# Altium footprint library 我的器件.PCBLIB: 450 footprints (part 20 of 29)
Each footprint in its own frame and in the unit in brackets; x right, y up, seen from the top. Pads: shape width x height; smd on the part's side, far side on the other; paste and mask are expansions set on the pad; w line width, h text height; cw(c..) or ccw(c..) is an arc to the next point about the centre after c.
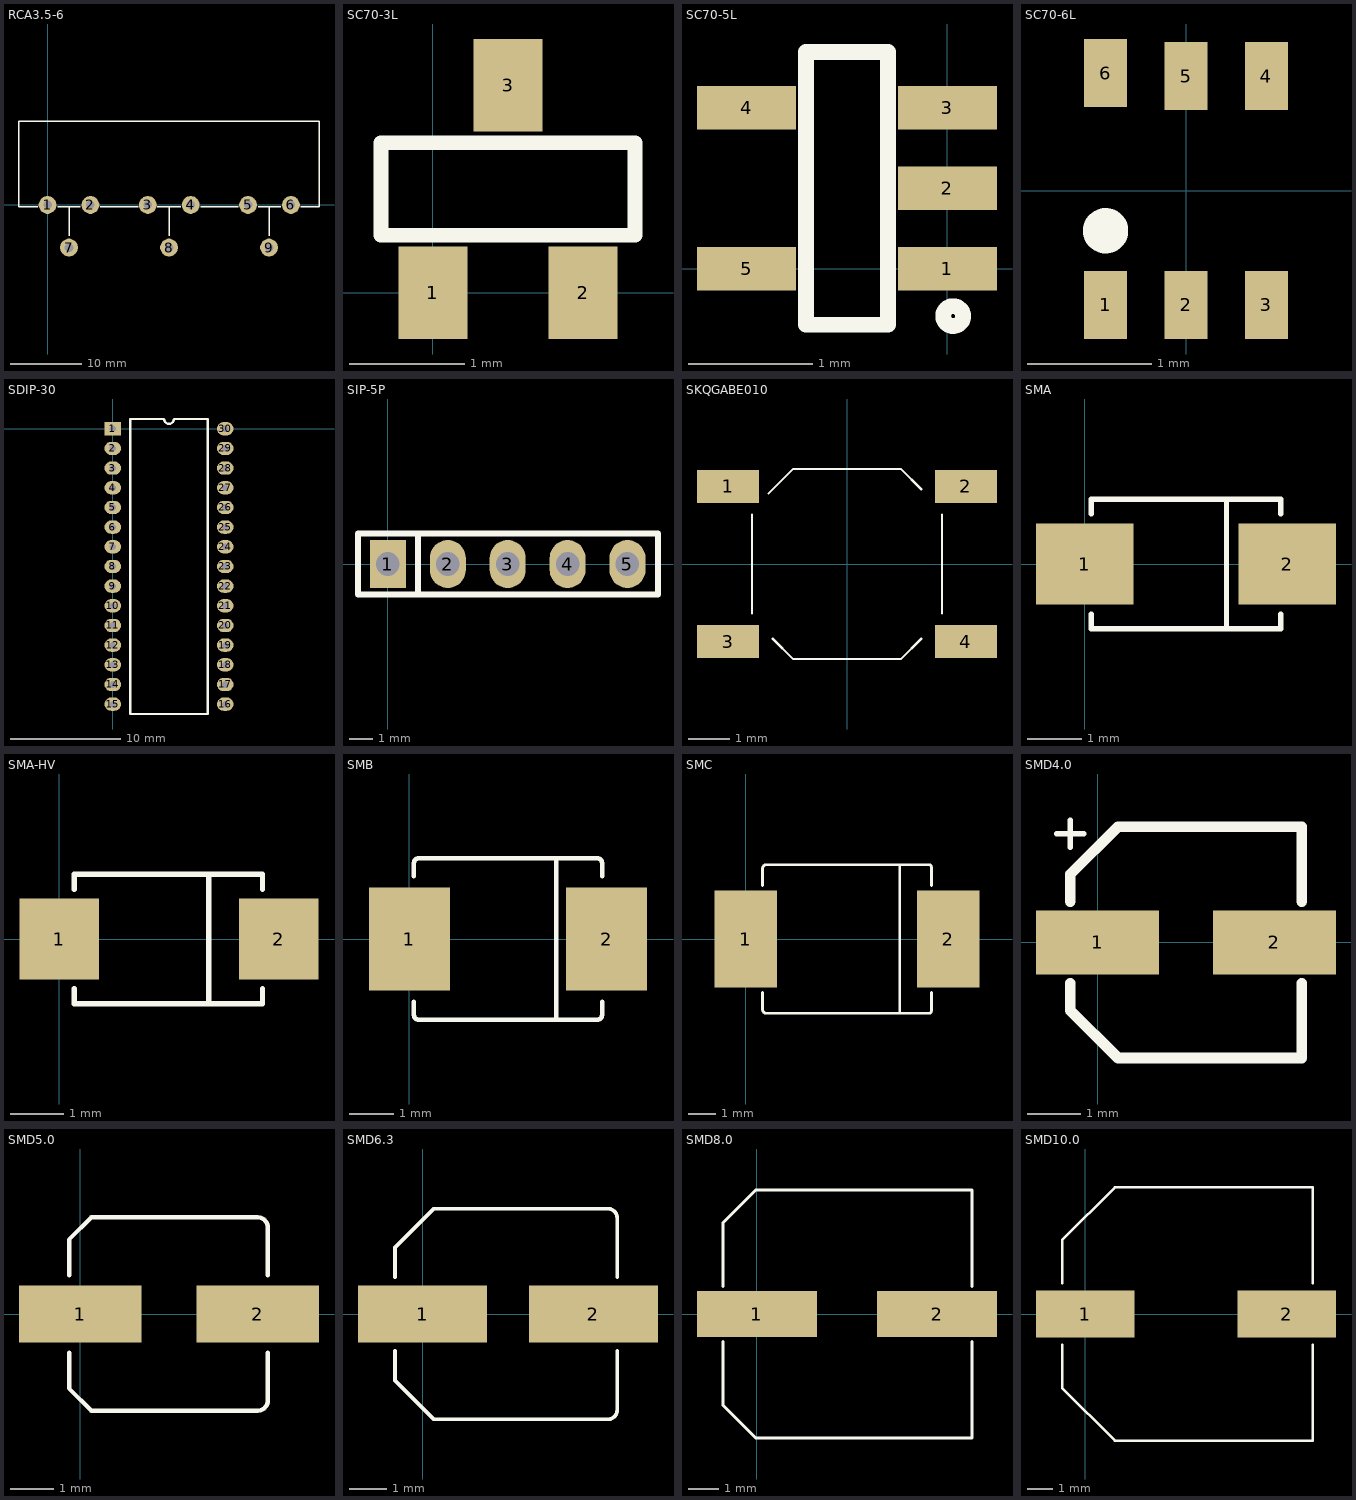
[diagram p19: the footprints below, top view; thin cyan lines are the x and y axes]

## RCA3.5-6 [mm]
pads (9):
  round 2.5 hole 1.2: 1(0,0) 2(6,0) 3(14.03,0) 4(20.03,0) 5(28.06,0) 6(34.06,0) 7(3,-5.969) 8(17,-5.969) 9(31,-5.969)
Top Overlay:
  lines w0.2: -1.397,-0.254 -4,-0.254 -4,11.684 37.985,11.684 37.985,-0.254 35.433,-0.254 ; 1.397,-0.254 4.572,-0.254 ; 3.048,-4.318 3.048,-0.254 ; 7.366,-0.254 12.7,-0.254 ; 15.367,-0.254 18.669,-0.254 ; 17.048,-4.318 17.048,-0.254 ; 21.463,-0.254 26.67,-0.254 ; 29.464,-0.254 32.639,-0.254 ; 31.048,-4.318 31.048,-0.254

## SC70-3L [mm]
height 4.45
pads (3):
  rect 0.6x0.8 smd: 1(0,0) 2(1.3,0) 3(0.65,1.8)
Top Overlay:
  lines w0.127: -0.45,0.5 -0.45,1.3 1.75,1.3 1.75,0.5 -0.45,0.5

## SC70-5L [mm]
height 1
pads (5):
  rect 0.8x0.35 smd: 1(0,0) 2(0,0.65) 3(0,1.3) 4(-1.62,1.3) 5(-1.62,0)
Top Overlay:
  circle w0.127: c0.047,-0.381 r0.08
  lines w0.127: -1.14,-0.45 -0.48,-0.45 -0.48,1.75 -1.14,1.75 -1.14,-0.45

## SC70-6L [mm]
height 1
pads (6):
  rect 0.35x0.55 smd: 1(-0.65,-0.925) 2(0,-0.925) 3(0.65,-0.925) 4(0.65,0.925) 5(0,0.925) 6(-0.65,0.95)
Top Overlay:
  circle w0.254: c-0.65,-0.325 r0.056
3D body: height 1.11, standoff 1.1, extent -0.799,-0.475 -0.5,-0.175
3D body: height 1.1, standoff 0.1, extent -1,-0.625 1,0.625
3D body: height 0.15, standoff 0, extent -0.15,0.8 0.15,1.2
3D body: height 0.7, standoff 0, extent -0.15,0.8 0.15,0.95
3D body: height 0.7, standoff 0.55, extent -0.15,0.625 0.15,0.8
3D body: height 0.7, standoff 0.55, extent 0.5,0.625 0.8,0.8
3D body: height 0.7, standoff 0, extent 0.5,0.8 0.8,0.95
3D body: height 0.15, standoff 0, extent 0.5,0.8 0.8,1.2
3D body: height 0.7, standoff 0.55, extent -0.8,0.625 -0.5,0.8
3D body: height 0.7, standoff 0, extent -0.8,0.8 -0.5,0.95
3D body: height 0.15, standoff 0, extent -0.8,0.8 -0.5,1.2
3D body: height 0.15, standoff 0, extent 0.5,-1.2 0.8,-0.8
3D body: height 0.7, standoff 0, extent 0.5,-0.95 0.8,-0.8
3D body: height 0.7, standoff 0.55, extent 0.5,-0.8 0.8,-0.625
3D body: height 0.15, standoff 0, extent -0.8,-1.2 -0.5,-0.8
3D body: height 0.7, standoff 0, extent -0.8,-0.95 -0.5,-0.8
3D body: height 0.7, standoff 0.55, extent -0.8,-0.8 -0.5,-0.625
3D body: height 0.7, standoff 0.55, extent -0.15,-0.8 0.15,-0.625
3D body: height 0.7, standoff 0, extent -0.15,-0.95 0.15,-0.8
3D body: height 0.15, standoff 0, extent -0.15,-1.2 0.15,-0.8

## SDIP-30 [mm]
pads (30):
  rect 1.5x1.2 hole 0.6: 1(0,0)
  oval 1.5x1.2 hole 0.6: 2(0,-1.778) 3(0,-3.556) 4(0,-5.334) 5(0,-7.112) 6(0,-8.89) 7(0,-10.668) 8(0,-12.446) 9(0,-14.224) 10(0,-16.002) 11(0,-17.78) 12(0,-19.558) 13(0,-21.336) 14(0,-23.114) 15(0,-24.892) 16(10.16,-24.892) 17(10.16,-23.114) 18(10.16,-21.336) 19(10.16,-19.558) 20(10.16,-17.78) 21(10.16,-16.002) 22(10.16,-14.224) 23(10.16,-12.446) 24(10.16,-10.668) 25(10.16,-8.89) 26(10.16,-7.112) 27(10.16,-5.334) 28(10.16,-3.556) 29(10.16,-1.778) 30(10.16,0)
Top Overlay:
  lines w0.2: 1.585,-25.781 1.585,0.889 4.635,0.889 ccw(c5.08,0.889) 5.524,0.889 8.575,0.889 8.575,-25.781 1.585,-25.781

## SIP-5P [mil]
height 393.7
pads (5):
  rect 60x80 hole 39.37: 1(0,0)
  oval 60x80 hole 39.37: 2(100,0) 3(200,0) 4(300,0) 5(400,0)
Top Overlay:
  lines w10: 50,-51 50,51 ; -50,-51 451,-51 451,51 -50,51 -50,-51

## SKQGABE010 [mm]
pads (4):
  rect 1.5x0.8 smd: 1(-2.875,1.875) 2(2.875,1.875) 3(-2.875,-1.875) 4(2.875,-1.875)
Top Overlay:
  lines w0.05: -2.3,-1.2 -2.3,1.2 ; -1.8,-1.8 -1.3,-2.3 1.3,-2.3 1.8,-1.8 ; 1.8,1.8 1.3,2.3 -1.3,2.3 -1.9,1.7 ; 2.3,-1.2 2.3,1.2 ; -1.9,1.7 -1.9,1.7
3D body: height 0.7, standoff 0.1, extent -2.55,-2.55 2.55,2.55
3D body: height 0.8, standoff 0.4, extent -2.6,-2.6 0,0
3D body: height 1.2, standoff 0.7, extent -1.9,0 0,1.9
3D body: height 1.2, standoff 0.7, extent -1.9,-1.9 0,0
3D body: height 1.2, standoff 0.7, extent 0,-1.9 1.9,0
3D body: height 1.2, standoff 0.7, extent 0,0 1.9,1.9
3D body: height 1.5, standoff 1, extent -0.999,-1 1,1
3D body: height 0.8, standoff 0.4, extent 0,-2.6 2.6,0
3D body: height 0.8, standoff 0.4, extent 0,0 2.6,2.6
3D body: height 0.8, standoff 0.4, extent -2.6,0 0,2.6
3D body: height 0.4, standoff 0.2, extent 1.75,-2.125 2.575,-1.625
3D body: height 0.2, standoff 0, extent 2.575,-2.125 3.2,-1.625
3D body: height 0.4, standoff 0, extent 2.475,-2.125 2.675,-1.625
3D body: height 0.4, standoff 0, extent -2.675,1.625 -2.475,2.125
3D body: height 0.2, standoff 0, extent -3.2,1.625 -2.575,2.125
3D body: height 0.4, standoff 0, extent -2.675,-2.125 -2.475,-1.625
3D body: height 0.2, standoff 0, extent -3.2,-2.125 -2.575,-1.625
3D body: height 0.4, standoff 0, extent 2.475,1.625 2.675,2.125
3D body: height 0.2, standoff 0, extent 2.575,1.625 3.2,2.125
3D body: height 0.4, standoff 0.2, extent 1.75,1.625 2.575,2.125
3D body: height 0.4, standoff 0.2, extent -2.575,-2.125 -1.75,-1.625
3D body: height 0.4, standoff 0.2, extent -2.575,1.625 -1.75,2.125

## SMA [mm] "Body 5.3 x 3.6 mm"
height 2.2
pads (2):
  rect 1.8x1.5 smd: 1(0,0) 2(3.75,0)
Top Overlay:
  lines w0.1: 0.125,-0.925 0.125,-1.2 3.625,-1.2 3.625,-0.925 ; 0.125,0.925 0.125,1.2 3.625,1.2 3.625,0.925 ; 2.625,-1.2 2.625,1.2
3D body: height 1, standoff 0, extent 3.89,-0.75 4.296,0.75
3D body: height 2.01, standoff 2, extent 3.19,-1.3 3.59,1.3
3D body: height 2, standoff 0, extent -0.125,-1.321 3.875,1.321
3D body: height 1, standoff 0, extent -0.516,-0.75 -0.11,0.75

## SMA-HV [mm]
pads (2):
  rect 1.475x1.5 smd: 1(0,0) 2(4.075,0)
Top Overlay:
  lines w0.1: 0.275,-0.925 0.275,-1.2 3.775,-1.2 3.775,-0.925 ; 0.275,0.925 0.275,1.2 3.775,1.2 3.775,0.925 ; 2.775,-1.2 2.775,1.2
3D body: height 1, standoff 0, extent 4.04,-0.75 4.446,0.75
3D body: height 2.01, standoff 2, extent 3.34,-1.3 3.74,1.3
3D body: height 2, standoff 0, extent 0.04,-1.321 4.04,1.321
3D body: height 1, standoff 0, extent -0.366,-0.75 0.04,0.75

## SMB [mm]
height 3
pads (2):
  rect 1.8x2.3 smd: 1(0,0) 2(4.4,0)
Top Overlay:
  lines w0.1: 0.1,-1.4 0.1,-1.7 ccw(c0.2,-1.7) 0.2,-1.8 4.2,-1.8 ccw(c4.2,-1.7) 4.3,-1.7 4.3,-1.4 ; 0.1,1.4 0.1,1.7 cw(c0.2,1.7) 0.2,1.8 4.2,1.8 cw(c4.2,1.7) 4.3,1.7 4.3,1.4 ; 3.275,-1.8 3.275,1.8
3D body: height 1.2, standoff 0.1, extent -0.635,-1.143 -0.127,1.143
3D body: height 2, standoff 0.1, extent -0.137,-1.93 4.537,1.93
3D body: height 1.2, standoff 0.1, extent 4.527,-1.143 5.035,1.143
3D body: height 2.01, standoff 2, extent 3.546,-1.936 4.004,1.925

## SMC [mm] "Body 6.7mmX5.8mm"
height 2.6
pads (2):
  rect 2.3x3.6 smd: 1(0,0) 2(7.493,0)
Top Overlay:
  lines w0.1: 0.621,-1.975 0.621,-2.6 ccw(c0.771,-2.6) 0.771,-2.75 6.772,-2.75 ccw(c6.772,-2.65) 6.872,-2.65 6.872,-1.975 ; 0.621,1.975 0.621,2.6 cw(c0.771,2.6) 0.771,2.75 6.772,2.75 cw(c6.772,2.65) 6.872,2.65 6.872,1.975 ; 5.697,-2.75 5.697,2.75
3D body: height 1.4, standoff 0, extent -0.554,-1.702 0.246,1.702
3D body: height 2.01, standoff 2, extent 5.247,-3 6.647,3
3D body: height 2, standoff 0.1, extent 0.246,-3 7.247,3
3D body: height 1.4, standoff 0, extent 7.247,-1.702 8.047,1.702

## SMD4.0 [mm]
height 6
pads (2):
  rect 2.3x1.2 smd: 1(0,0) 2(3.302,0)
Top Overlay:
  lines w0.1: -0.762,2.032 -0.254,2.032 ; -0.508,1.778 -0.508,2.286
  lines w0.2: -0.508,-0.762 -0.508,-1.27 0.381,-2.159 3.81,-2.159 3.81,-0.762 ; -0.508,0.762 -0.508,1.27 0.381,2.159 3.81,2.159 3.81,0.762

## SMD5.0 [mm]
pads (2):
  rect 2.8x1.3 smd: 1(0,0) 2(4.064,0)
Top Overlay:
  lines w0.1: -0.254,-0.889 -0.254,-1.702 0.254,-2.21 4.064,-2.21 ccw(c4.064,-1.981) 4.293,-1.981 4.293,-0.889 ; -0.254,0.889 -0.254,1.702 0.254,2.21 4.064,2.21 cw(c4.064,1.981) 4.293,1.981 4.293,0.889
3D body: height 1, standoff 0, extent -0.6,-2.5 4.632,2.5
3D body: height 5.5, standoff 0, extent -0.448,-2.495 4.532,2.495
3D body: height 0.3, standoff 0, extent -0.879,-0.6 -0.6,0.6
3D body: height 0.3, standoff 0, extent 4.664,-0.6 4.943,0.6

## SMD6.3 [mil]
pads (2):
  rect 136x60 smd: 1(0,0) 2(180,0)
Top Overlay:
  lines w3.94: -29,-39 -29,-70 12,-111 195,-111 ccw(c195,-101) 205,-101 205,-39 ; -29,39 -29,70 12,111 195,111 cw(c195,101) 205,101 205,39
3D body: height 299.21, standoff 0, extent -32.53,-125 214.53,122.54
3D body: height 39.37, standoff 0, extent -48,-131 227,130
3D body: height 11.81, standoff 0, extent -59,-30 -48,30
3D body: height 11.81, standoff 0, extent 227,-30 238,30

## SMD8.0 [mm]
height 10
pads (2):
  rect 4x1.524 smd: 1(0,0) 2(6,0)
Top Overlay:
  lines w0.1: -1.125,-0.925 -1.125,-3.05 -0.05,-4.125 7.175,-4.125 7.175,-0.925 ; -1.125,0.925 -1.125,3.05 -0.05,4.125 7.175,4.125 7.175,0.925
3D body: height 10.5, standoff 0.5, extent -0.984,-4.013 6.984,3.971
3D body: height 2, standoff 0, extent -1.293,-4.318 7.318,4.293
3D body: height 0.2, standoff 0, extent -1.801,-0.762 -1.293,0.762
3D body: height 0.2, standoff 0, extent 7.318,-0.775 7.826,0.749

## SMD10.0 [mm]
height 10.2
pads (2):
  rect 3.8x1.8 smd: 1(0,0) 2(7.8,0)
Top Overlay:
  lines w0.1: -0.891,-1.2 -0.891,-2.859 1.15,-4.9 8.809,-4.9 8.809,-1.2 ; -0.891,1.2 -0.891,2.859 1.15,4.9 8.809,4.9 8.809,1.2
3D body: height 2, standoff 0, extent -1.3,-5.2 9.1,5.2
3D body: height 10.1, standoff 0.1, extent -1.1,-5 8.9,5
3D body: height 0.5, standoff 0, extent -1.7,-0.6 -1.3,0.6
3D body: height 0.5, standoff 0, extent 9.1,-0.6 9.5,0.6